# Altium footprint library Mine.PcbLib: 306 footprints (part 14 of 20)
Each footprint in its own frame and in the unit in brackets; x right, y up, seen from the top. Pads: shape width x height; smd on the part's side, far side on the other; paste and mask are expansions set on the pad; w line width, h text height; cw(c..) or ccw(c..) is an arc to the next point about the centre after c.
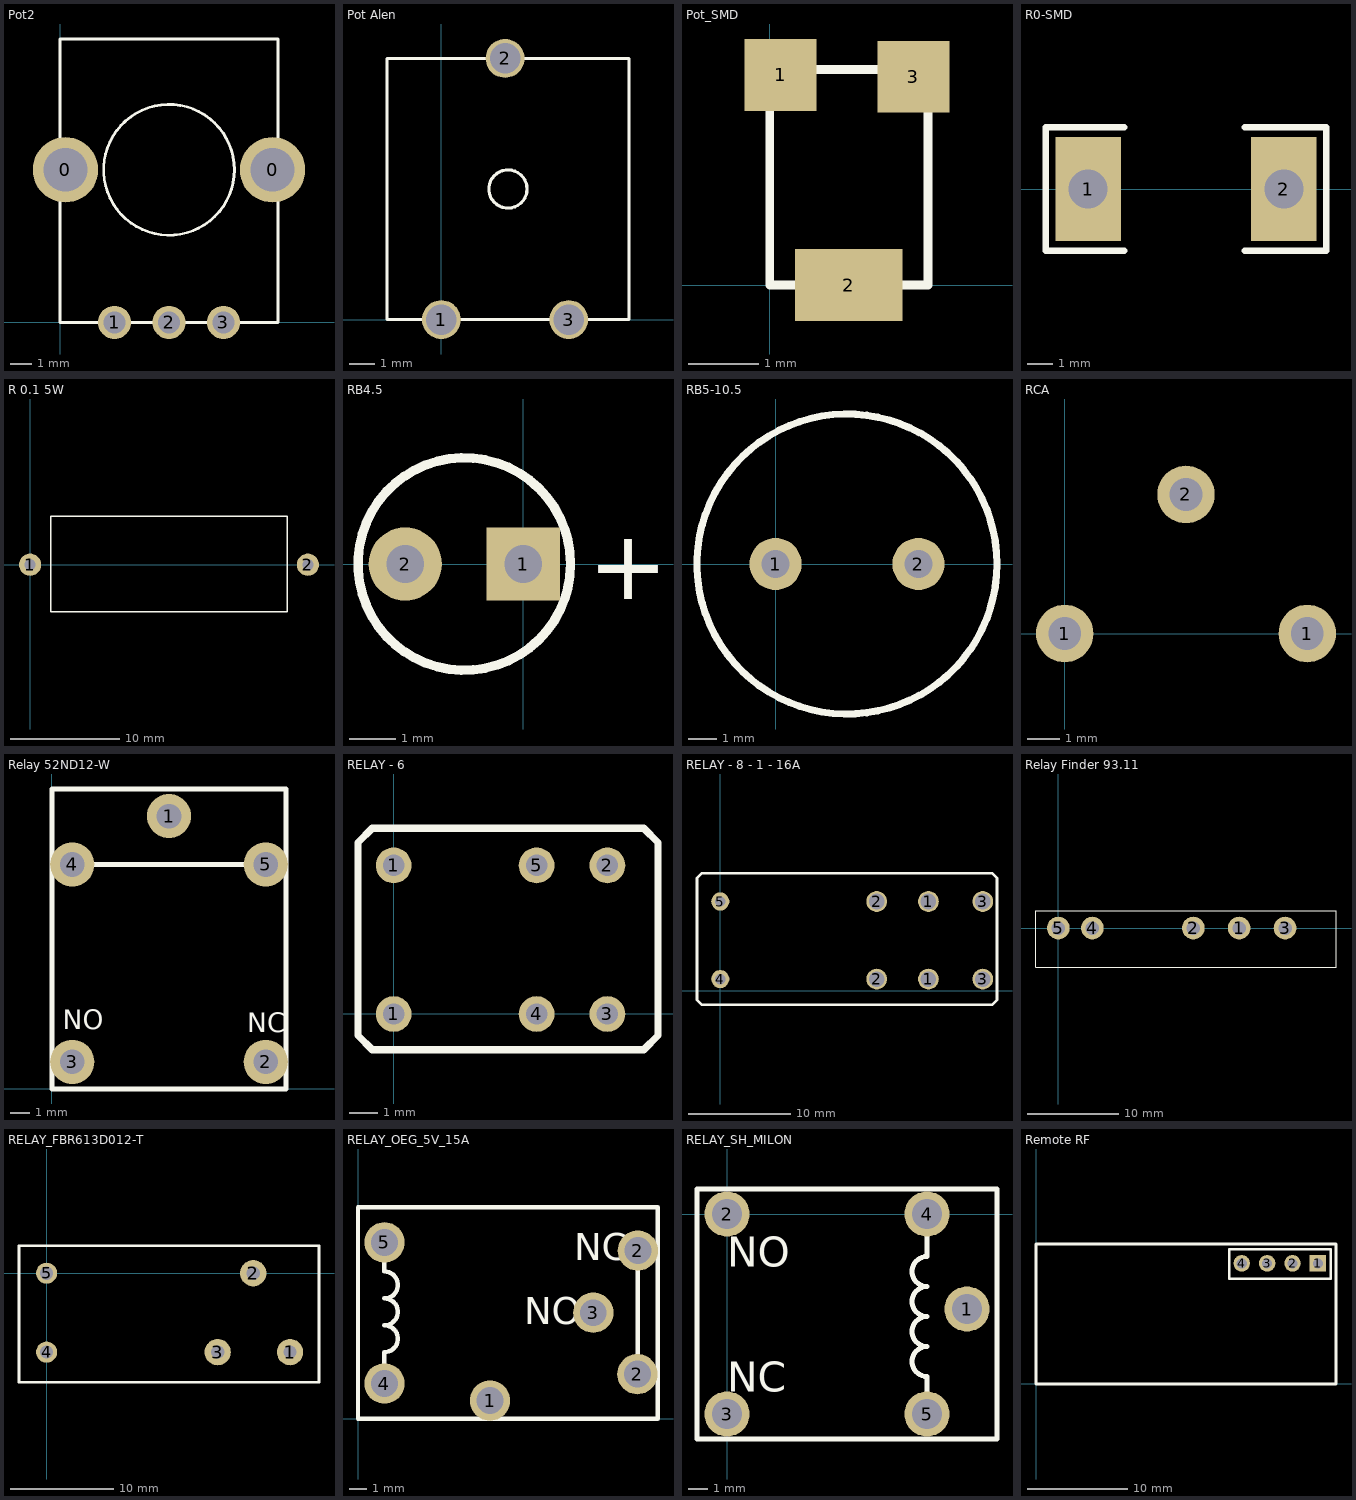
[diagram p13: the footprints below, top view; thin cyan lines are the x and y axes]

## Pot2 [mm]
height 8
pads (5):
  round 3 hole 2: 0(0.25,7) 0(9.75,7)
  round 1.524 hole 1.016: 1(2.5,0) 2(5,0) 3(7.5,0)
Top Overlay:
  circle w0.127: c5,7 r3
  lines w0.127: 0,0 0,13 10,13 10,0 0,0

## Pot Alen [mil]
height 236.22
pads (3):
  round 60 hole 47.24: 1(0,0) 2(98.43,403.54) 3(196.85,0)
Top Overlay:
  circle w5: c102.99,201.77 r29.53
  lines w5: -84.02,0 -84.02,403.54 290,403.54 290,0 -84,0

## Pot_SMD [mil]
pads (3):
  rect 40x40 smd: 1(6,117) 3(80,116)
  rect 60x40 smd: 2(44,0)
Top Overlay:
  lines w5: 0,0 88,0 88,120 0,120 0,0

## R0-SMD [mil]
pads (2):
  rect 100x160 on Top hole 60: 1(150,0) 2(450,0)
Top Overlay:
  lines w10: 205,-95 85,-95 85,95 205,95 ; 390,-95 515,-95 515,95 390,95

## R 0.1 5W [mil]
pads (2):
  round 80 hole 40: 1(0,0) 2(1000,0)
Top Overlay:
  lines w5: 75,-170 925,-170 925,175 75,175 75,-170

## RB4.5 [mil]
pads (2):
  rect 62x62 hole 32: 1(0,0)
  round 62 hole 32: 2(-100,0)
Top Overlay:
  circle w7.87: c-50,0 r90
  text "+" at 55,-30 h59.06

## RB5-10.5 [mil]
pads (2):
  round 72 hole 39: 1(0,0) 2(196.85,0)
Top Overlay:
  circle w9.84: c98.43,0 r206.69

## RCA [mil]
pads (3):
  round 70 hole 40: 1(0,0) 1(295.28,0) 2(147.64,169.29)

## Relay 52ND12-W [mil]
height 551.18
pads (5):
  round 90 hole 50: 1(238.19,555.12) 2(435.04,55.12) 3(41.34,55.12) 4(41.34,456.69) 5(435.04,456.69)
Top Overlay:
  lines w10: 41.34,456.69 435.04,456.69 ; 472.44,0 0,0 0,610.24 472.44,610.24 ; 476.38,0 476.38,610.24
  text "NO" at 21.65,122.05 h39.37
  text "NC" at 397.64,115.16 h39.37
3D body: height 551.18, standoff 7.87, extent 0,0 475,610

## RELAY - 6 [mil]
height 393.7
pads (6):
  round 50 hole 30: 1(0,0) 1(0,208) 2(299.21,208) 3(299.21,0) 4(200,0) 5(200,208)
Top Overlay:
  lines w10: -50,-30 -50,240 -30,260 350,260 370,240 370,-30 350,-50 -20,-50 -30,-50 -50,-30

## RELAY - 8 - 1 - 16A [mil]
pads (8):
  round 80 hole 60: 1(805,45) 1(805,345) 2(605,45) 2(605,345) 3(1015,45) 3(1015,345)
  round 70 hole 40: 4(0,45) 5(0,345)
Top Overlay:
  lines w10: -90,-35 -70,-55 -60,-55 1050,-55 1070,-35 1070,435 1050,455 -70,455 -90,435 -90,-35

## Relay Finder 93.11 [mm]
height 31
pads (5):
  round 2.5 hole 1.5: 1(19.9,0) 2(14.85,0) 3(24.95,0) 4(3.75,0) 5(0,0)
Top Overlay:
  lines w0.127: -2.45,-4.3 -2.45,1.9 30.55,1.9 30.55,-4.3 -2.45,-4.3
3D body "3451.stp": height 14.86, standoff -3.64, extent -1.046,-3.81 26.954,1.19

## RELAY_FBR613D012-T [mil]
pads (5):
  round 100 hole 50: 1(925,-300) 2(785,0) 3(650,-300)
  round 80 hole 50: 4(0,-300) 5(0,0)
Top Overlay:
  lines w10: -105,-415 1035,-415 1035,105 -105,105 -105,-415

## RELAY_OEG_5V_15A [mil]
pads (6):
  round 90 hole 60: 1(294.57,40.93) 2(623.35,100) 2(624.35,375.59) 3(524.93,237) 4(59,79) 5(59,393.96)
Top Overlay:
  lines w10: 59,79 59,149 ccw(c59,179) 59,209 ccw(c59,239) 59,269 ccw(c59,299) 59,329 59,393.96 ; 624,99.41 624,374 ; 625,98.41 625,137.57 ; 0,0 669.29,0 669.29,472.44 0,472.44 0,0
  text "NO" at 371,211 h60
  text "NC" at 483,354 h60

## RELAY_SH_MILON [mil]
pads (5):
  round 90 hole 60: 1(480,-190) 2(0,0) 3(0,-400) 4(400,0) 5(400,-400)
Top Overlay:
  lines w10: 400,-400 400,-325 cw(c400,-295) 400,-265 cw(c400,-235) 400,-205 cw(c400,-175) 400,-145 cw(c400,-115) 400,-85 400,0 ; -60,-450 -60,50 540,50 540,-450 -60,-450
  text "NO" at 0,-105 h60
  text "NC" at 0,-355 h60

## Remote RF [mil]
height 314.96
pads (4):
  rect 65x65 hole 40: 1(1110,475)
  round 65 hole 40: 2(1010,475) 3(910,475) 4(810,475)
Top Overlay:
  lines w10: 0,0 0,551.18 1181.1,551.18 1181.1,0 0,0 ; 760,415 1160,415 1160,530 760,530 760,415